# Altium footprint library fszhang.PcbLib: 1032 footprints (part 34 of 66)
Each footprint in its own frame and in the unit in brackets; x right, y up, seen from the top. Pads: shape width x height; smd on the part's side, far side on the other; paste and mask are expansions set on the pad; w line width, h text height; cw(c..) or ccw(c..) is an arc to the next point about the centre after c.
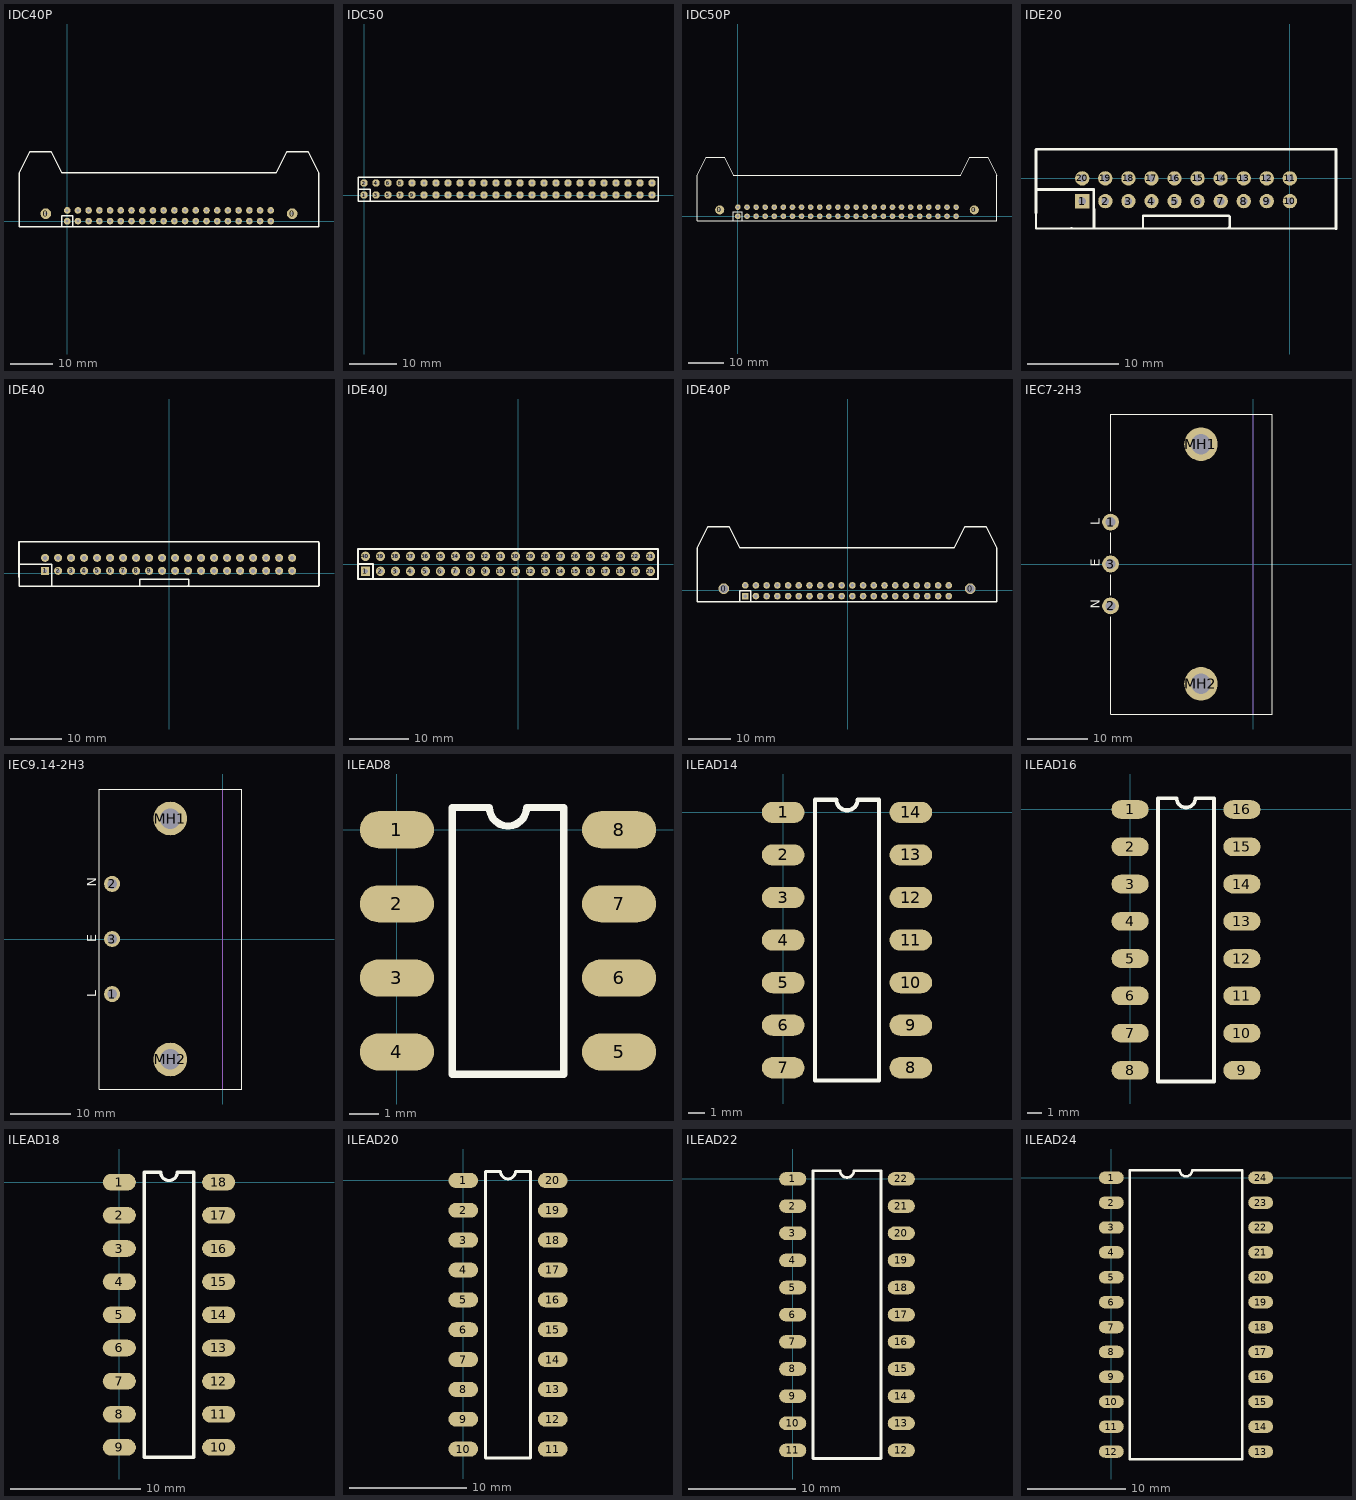
[diagram p33: the footprints below, top view; thin cyan lines are the x and y axes]

## IDC40P [mil]
pads (42):
  round 100 hole 28: 0(-200,70) 0(2100,70)
  oct 62x62 hole 28: 1(0,0)
  round 62 hole 28: 2(0,100) 3(100,0) 4(100,100) 5(200,0) 6(200,100) 7(300,0) 8(300,100) 9(400,0) 10(400,100) 11(500,0) 12(500,100) 13(600,0) 14(600,100) 15(700,0) 16(700,100) 17(800,0) 18(800,100) 19(900,0) 20(900,100) 21(1000,0) 22(1000,100) 23(1100,0) 24(1100,100) 25(1200,0) 26(1200,100) 27(1300,0) 28(1300,100) 29(1400,0) 30(1400,100) 31(1500,0) 32(1500,100) 33(1600,0) 34(1600,100) 35(1700,0) 36(1700,100) 37(1800,0) 38(1800,100) 39(1900,0) 40(1900,100)
Top Overlay:
  lines w12: -50,-50 -50,50 50,50 50,-50 ; -450,-50 2350,-50 2350,450 2250,650 2050,650 1950,450 -50,450 -150,650 -350,650 -450,450 -450,-50

## IDC50 [mil]
pads (50):
  oct 62x62 hole 28: 1(0,0)
  round 62 hole 28: 2(0,100) 3(100,0) 4(100,100) 5(200,0) 6(200,100) 7(300,0) 8(300,100) 9(400,0) 10(400,100) 11(500,0) 12(500,100) 13(600,0) 14(600,100) 15(700,0) 16(700,100) 17(800,0) 18(800,100) 19(900,0) 20(900,100) 21(1000,0) 22(1000,100) 23(1100,0) 24(1100,100) 25(1200,0) 26(1200,100) 27(1300,0) 28(1300,100) 29(1400,0) 30(1400,100) 31(1500,0) 32(1500,100) 33(1600,0) 34(1600,100) 35(1700,0) 36(1700,100) 37(1800,0) 38(1800,100) 39(1900,0) 40(1900,100) 41(2000,0) 42(2000,100) 43(2100,0) 44(2100,100) 45(2200,0) 46(2200,100) 47(2300,0) 48(2300,100) 49(2400,0) 50(2400,100)
Top Overlay:
  lines w12: -50,50 50,50 50,-50 ; -50,-50 -50,150 2450,150 2450,-50 -50,-50

## IDC50P [mil]
pads (52):
  round 100 hole 28: 0(-200,70) 0(2600,70)
  oct 62x62 hole 28: 1(0,0)
  round 62 hole 28: 2(0,100) 3(100,0) 4(100,100) 5(200,0) 6(200,100) 7(300,0) 8(300,100) 9(400,0) 10(400,100) 11(500,0) 12(500,100) 13(600,0) 14(600,100) 15(700,0) 16(700,100) 17(800,0) 18(800,100) 19(900,0) 20(900,100) 21(1000,0) 22(1000,100) 23(1100,0) 24(1100,100) 25(1200,0) 26(1200,100) 27(1300,0) 28(1300,100) 29(1400,0) 30(1400,100) 31(1500,0) 32(1500,100) 33(1600,0) 34(1600,100) 35(1700,0) 36(1700,100) 37(1800,0) 38(1800,100) 39(1900,0) 40(1900,100) 41(2000,0) 42(2000,100) 43(2100,0) 44(2100,100) 45(2200,0) 46(2200,100) 47(2300,0) 48(2300,100) 49(2400,0) 50(2400,100)
Top Overlay:
  lines w12: -50,-50 -50,50 50,50 50,-50 ; -450,-50 -450,450 -350,650 -150,650 -50,450 2450,450 2550,650 2750,650 2850,450 2850,-50 -450,-50

## IDE20 [mil]
pads (20):
  rect 62x62 hole 31.94: 1(-899.87,-100.13)
  round 62 hole 31.94: 2(-799.87,-100.13) 3(-699.87,-100.13) 4(-599.87,-100.13) 5(-499.87,-100.13) 6(-399.87,-100.13) 7(-299.87,-100.13) 8(-199.87,-100.13) 9(-99.87,-100.13) 10(0.13,-100.13) 11(-0.13,-1.37) 12(-100.13,-1.37) 13(-200.13,-1.37) 14(-300.13,-1.37) 15(-400.13,-1.37) 16(-500.13,-1.37) 17(-600.13,-1.37) 18(-700.13,-1.37) 19(-800.13,-1.37) 20(-900.13,-1.37)
Top Overlay:
  lines w10: -1100.5,-149 -1100.5,-218 -1099.5,-219 -951,-219 ; -637,-218 -637,-163.5 -264,-163.5 -260,-167.5 -260,-210 -264.5,-214.5
  lines w12: -1100.5,-151 -1100.5,120.5 ; -1100.5,124 200,125 ; -1100,-49.5 -849.87,-50.13 -849.5,-214 ; -947,-218 200,-220 ; 200,-213 200,120

## IDE40 [mil]
pads (40):
  rect 62x62 hole 31.94: 1(-952.87,17.87)
  round 62 hole 31.94: 2(-852.87,17.87) 3(-752.87,17.87) 4(-652.87,17.87) 5(-552.87,17.87) 6(-452.87,17.87) 7(-352.87,17.87) 8(-252.87,17.87) 9(-152.87,17.87) 10(-52.87,17.87) 11(47.13,17.87) 12(147.13,17.87) 13(247.13,17.87) 14(347.13,17.87) 15(447.13,17.87) 16(547.13,17.87) 17(647.13,17.87) 18(747.13,17.87) 19(847.13,17.87) 20(947.13,17.87) 21(947.13,117.87) 22(847.13,117.87) 23(747.13,117.87) 24(647.13,117.87) 25(547.13,117.87) 26(447.13,117.87) 27(347.13,117.87) 28(247.13,117.87) 29(147.13,117.87) 30(47.13,117.87) 31(-52.87,117.87) 32(-152.87,117.87) 33(-252.87,117.87) 34(-352.87,117.87) 35(-452.87,117.87) 36(-552.87,117.87) 37(-652.87,117.87) 38(-752.87,117.87) 39(-852.87,117.87) 40(-952.87,117.87)
Top Overlay:
  lines w10: -1153.5,-31 -1153.5,-100 -1152.5,-101 -1004,-101 ; -226,-100 -226,-45.5 147,-45.5 151,-49.5 151,-92 146.5,-96.5
  lines w12: -1153.5,-33 -1153.5,238.5 ; -1153.5,242 1152,240.5 ; -1153,68.5 -902.87,67.87 -902.5,-96 ; -1005,-100 1150,-100 ; 1153.5,-97.5 1153.5,235.5

## IDE40J [mil]
pads (40):
  rect 62x62 hole 31.94: 1(-1018.87,-48.63)
  round 62 hole 31.94: 2(-918.87,-48.63) 3(-818.87,-48.63) 4(-718.87,-48.63) 5(-618.87,-48.63) 6(-518.87,-48.63) 7(-418.87,-48.63) 8(-318.87,-48.63) 9(-218.87,-48.63) 10(-118.87,-48.63) 11(-18.87,-48.63) 12(81.13,-48.63) 13(181.13,-48.63) 14(281.13,-48.63) 15(381.13,-48.63) 16(481.13,-48.63) 17(581.13,-48.63) 18(681.13,-48.63) 19(781.13,-48.63) 20(881.13,-48.63) 21(881.13,51.37) 22(781.13,51.37) 23(681.13,51.37) 24(581.13,51.37) 25(481.13,51.37) 26(381.13,51.37) 27(281.13,51.37) 28(181.13,51.37) 29(81.13,51.37) 30(-18.87,51.37) 31(-118.87,51.37) 32(-218.87,51.37) 33(-318.87,51.37) 34(-418.87,51.37) 35(-518.87,51.37) 36(-618.87,51.37) 37(-718.87,51.37) 38(-818.87,51.37) 39(-918.87,51.37) 40(-1018.87,51.37)
Top Overlay:
  lines w12: -1068.5,0 -968.5,0 -968.5,-100 ; -1068.5,-100 -1068.5,100 931.5,100 931.5,-100 -1068.5,-100

## IDE40P [mil]
pads (42):
  round 100 hole 78.74: 0(-1154.84,16.42) 0(1145.16,16.42)
  rect 62x62 hole 31.94: 1(-954.84,-53.58)
  round 62 hole 31.94: 2(-854.84,-53.58) 3(-754.84,-53.58) 4(-654.84,-53.58) 5(-554.84,-53.58) 6(-454.84,-53.58) 7(-354.84,-53.58) 8(-254.84,-53.58) 9(-154.84,-53.58) 10(-54.84,-53.58) 11(45.16,-53.58) 12(145.16,-53.58) 13(245.16,-53.58) 14(345.16,-53.58) 15(445.16,-53.58) 16(545.16,-53.58) 17(645.16,-53.58) 18(745.16,-53.58) 19(845.16,-53.58) 20(945.16,-53.58) 21(945.16,46.42) 22(845.16,46.42) 23(745.16,46.42) 24(645.16,46.42) 25(545.16,46.42) 26(445.16,46.42) 27(345.16,46.42) 28(245.16,46.42) 29(145.16,46.42) 30(45.16,46.42) 31(-54.84,46.42) 32(-154.84,46.42) 33(-254.84,46.42) 34(-354.84,46.42) 35(-454.84,46.42) 36(-554.84,46.42) 37(-654.84,46.42) 38(-754.84,46.42) 39(-854.84,46.42)
  round 61.81 hole 31.93: 40(-954.84,46.42)
Top Overlay:
  lines w12: -1004.84,-103.58 -1004.84,-3.58 -904.84,-3.58 -904.84,-103.58 ; -1404.84,-103.58 -1404.84,396.42 -1304.84,596.42 -1104.84,596.42 -1004.84,396.42 995.16,396.42 1095.16,596.42 1295.16,596.42 1395.16,396.42 1395.16,-103.58 -1404.84,-103.58

## IEC7-2H3 [mm] "Mains Power Outlet, IEC60 320-2-2 F, PC Flange Rear Mount"
height 30.4
pads (5):
  round 2.8 hole 1.7: 1(-23.8,7) 2(-23.8,-7) 3(-23.8,0)
  round 5.6 hole 3.4: MH1(-8.7,20) MH2(-8.7,-20)
Top Overlay:
  lines w0.2: -23.8,-8.8 -23.8,-25.05 3.2,-25.05 3.2,25.05 -23.8,25.05 -23.8,8.8 ; -23.8,-5.2 -23.8,-1.8 ; -23.8,1.8 -23.8,5.2
  text "L" at -25.6,6.5 h1.5
  text "E" at -25.6,-0.5 h1.5
  text "N" at -25.6,-7.5 h1.5
Mechanical 1:
  lines w0.1: 0,-25.05 0,25.05
  text "PCB Edge" at -0.4,-24.4 h0.5

## IEC9.14-2H3 [mm] "Mains Power Inlet, IEC60 320-1 C14, PC Flange Rear Mount"
height 27.8
pads (5):
  round 2.65 hole 1.6: 1(-18.35,-9.14) 2(-18.35,9.14) 3(-18.35,0)
  round 5.6 hole 3.4: MH1(-8.7,20) MH2(-8.7,-20)
Top Overlay:
  lines w0.2: -20.5,-24.9 -20.5,24.9 3.2,24.9 3.2,-24.9 -20.5,-24.9
  text "N" at -21,8.64 h1.5
  text "E" at -21,-0.5 h1.5
  text "L" at -21,-9.64 h1.5
Mechanical 1:
  lines w0.1: 0,-24.9 0,24.9
  text "PCB Edge" at -0.383,-24.4 h0.5

## ILEAD8 [mil]
pads (8):
  oval 100x50 smd: 1(0,0) 2(0,-100) 3(0,-200) 4(0,-300) 5(300,-300) 6(300,-200) 7(300,-100) 8(300,0)
Top Overlay:
  lines w10: 75,-330 75,30 125,30 ccw(c150,30) 175,30 225,30 225,-330 75,-330

## ILEAD14 [mil]
pads (14):
  oval 100x50 smd: 1(0,0) 2(0,-100) 3(0,-200) 4(0,-300) 5(0,-400) 6(0,-500) 7(0,-600) 8(300,-600) 9(300,-500) 10(300,-400) 11(300,-300) 12(300,-200) 13(300,-100) 14(300,0)
Top Overlay:
  lines w10: 75,-630 225,-630 225,30 175,30 cw(c150,30) 125,30 75,30 75,-630

## ILEAD16 [mil]
pads (16):
  oval 100x50 smd: 1(0,0) 2(0,-100) 3(0,-200) 4(0,-300) 5(0,-400) 6(0,-500) 7(0,-600) 8(0,-700) 9(300,-700) 10(300,-600) 11(300,-500) 12(300,-400) 13(300,-300) 14(300,-200) 15(300,-100) 16(300,0)
Top Overlay:
  lines w10: 75,-730 75,30 125,30 ccw(c150,30) 175,30 225,30 225,-730 75,-730

## ILEAD18 [mil]
pads (18):
  oval 100x50 smd: 1(0,0) 2(0,-100) 3(0,-200) 4(0,-300) 5(0,-400) 6(0,-500) 7(0,-600) 8(0,-700) 9(0,-800) 10(300,-800) 11(300,-700) 12(300,-600) 13(300,-500) 14(300,-400) 15(300,-300) 16(300,-200) 17(300,-100) 18(300,0)
Top Overlay:
  lines w10: 75,-830 225,-830 225,30 175,30 cw(c150,30) 125,30 75,30 75,-830

## ILEAD20 [mil]
pads (20):
  oval 100x50 smd: 1(0,0) 2(0,-100) 3(0,-200) 4(0,-300) 5(0,-400) 6(0,-500) 7(0,-600) 8(0,-700) 9(0,-800) 10(0,-900) 11(300,-900) 12(300,-800) 13(300,-700) 14(300,-600) 15(300,-500) 16(300,-400) 17(300,-300) 18(300,-200) 19(300,-100) 20(300,0)
Top Overlay:
  lines w10: 75,-930 75,30 125,30 ccw(c150,30) 175,30 225,30 225,-930 75,-930

## ILEAD22 [mil]
pads (22):
  oval 100x50 smd: 1(0,0) 2(0,-100) 3(0,-200) 4(0,-300) 5(0,-400) 6(0,-500) 7(0,-600) 8(0,-700) 9(0,-800) 10(0,-900) 11(0,-1000) 12(400,-1000) 13(400,-900) 14(400,-800) 15(400,-700) 16(400,-600) 17(400,-500) 18(400,-400) 19(400,-300) 20(400,-200) 21(400,-100) 22(400,0)
Top Overlay:
  lines w10: 75,-1030 75,30 175,30 ccw(c200,30) 225,30 325,30 325,-1030 75,-1030

## ILEAD24 [mil]
pads (24):
  oval 100x50 smd: 1(0,0) 2(0,-100) 3(0,-200) 4(0,-300) 5(0,-400) 6(0,-500) 7(0,-600) 8(0,-700) 9(0,-800) 10(0,-900) 11(0,-1000) 12(0,-1100) 13(600,-1100) 14(600,-1000) 15(600,-900) 16(600,-800) 17(600,-700) 18(600,-600) 19(600,-500) 20(600,-400) 21(600,-300) 22(600,-200) 23(600,-100) 24(600,0)
Top Overlay:
  lines w10: 75,-1130 75,30 275,30 ccw(c300,30) 325,30 525,30 525,-1130 75,-1130